# Altium footprint library CUSTOM PCB.PcbLib: 404 footprints (part 18 of 26)
Each footprint in its own frame and in the unit in brackets; x right, y up, seen from the top. Pads: shape width x height; smd on the part's side, far side on the other; paste and mask are expansions set on the pad; w line width, h text height; cw(c..) or ccw(c..) is an arc to the next point about the centre after c.
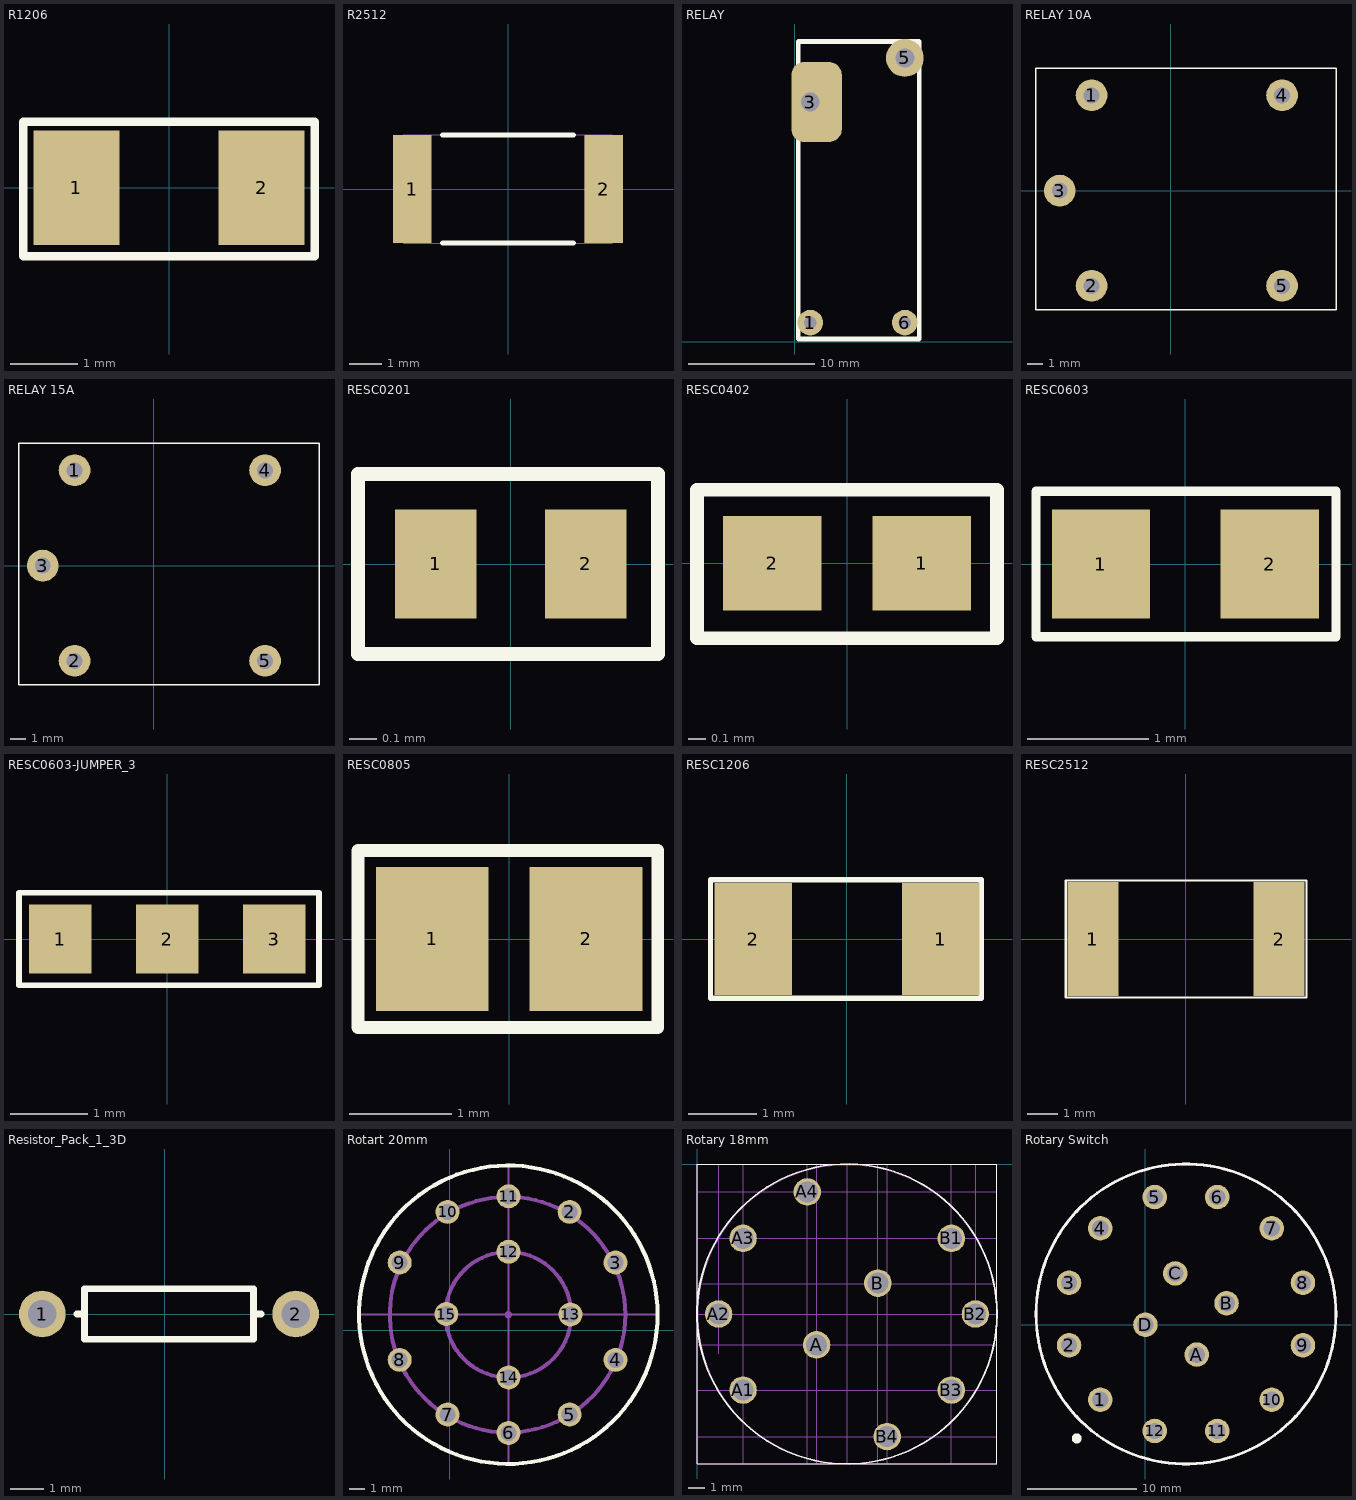
[diagram p17: the footprints below, top view; thin cyan lines are the x and y axes]

## R1206 [mil]
pads (2):
  rect 50x67 smd paste+0 mask+0: 1(-54,0) 2(54,0)
Top Overlay:
  lines w5: -85,-40 -85,38.5 16.89,38.5 85,38.5 85,-40 -85,-40
3D body "STA_RNCP1206.step": height 24.02, standoff 0, extent -65,-33.5 65,33.5

## R2512 [mil]
pads (2):
  rect 47x132 smd: 1(-117,0) 2(117,0)
Top Overlay:
  lines w6: -80,-66 80,-66 ; -80,66 80,66
Mechanical 4:
  lines w0: -127,-66 -94,-66 ; -127,-66 -127,66 ; -127,-66 -94,-66 ; -127,-66 -127,66 ; -127,66 -94,66 ; -127,66 -94,66 ; -94,-66 -94,66 ; -94,-66 94,-66 ; -94,-66 -94,66 ; -94,-66 94,-66 ; -94,66 94,66 ; -94,66 94,66 ; 94,-66 94,66 ; 94,-66 127,-66 ; 94,-66 94,66 ; 94,-66 127,-66 ; 94,66 127,66 ; 94,66 127,66 ; 127,-66 127,66 ; 127,-66 127,66
3D body "RESISTOR 2512.step": height 22.83, standoff -1.18, extent -124.99,-64.16 125.01,64.18

## RELAY [mm] "Relay Philips"
pads (4):
  round 2.032 hole 1: 1(1.25,1.5) 6(8.75,1.5)
  rrect50% 4x6.35 hole 1.5 copper offset 0.5,0: 3(1.25,19)
  round 3 hole 1.5: 5(8.75,22.505)
Top Overlay:
  lines w0.381: 0.3,0.2 0.3,23.8 9.9,23.8 9.9,0.2 1.2,0.2 0.3,0.2
3D body "adw1112hlw.step": height 15.59, standoff -3.41, extent 0.08,0.04 10.08,24.04

## RELAY 10A [mm]
pads (5):
  round 2 hole 1: 1(-5,6) 2(-5,-6) 3(-7,0) 4(7,6) 5(7,-6)
Top Overlay:
  lines w0.09: -8.5,-7.5 -8.5,7.7 10.4,7.7 10.4,-7.5 -8.5,-7.5
3D body "relevador.SLDPRT": height 15.4, standoff -2.4, extent -8.533,-7.7 10.667,7.7

## RELAY 15A [mm]
pads (5):
  round 2 hole 1: 1(-5,6) 2(-5,-6) 3(-7,0) 4(7,6) 5(7,-6)
Top Overlay:
  lines w0.09: -8.5,-7.5 10.4,-7.5 10.4,7.7 -8.5,7.7 -8.5,-7.5
3D body "relevador.SLDPRT": height 15.4, standoff -2.4, extent -8.533,-7.7 10.667,7.7

## RESC0201 [mm]
pads (2):
  rect 0.3x0.4 smd: 1(-0.275,0) 2(0.275,0)
Top Overlay:
  lines w0.051: -0.56,-0.33 -0.56,0.33 0.54,0.33 0.54,-0.33 -0.56,-0.33
3D body "44025.stp": height 0.15, standoff -0.15, extent -0.3,-0.15 0.3,0.15

## RESC0402 [mm]
pads (2):
  rect 0.55x0.53 smd: 1(0.419,0) 2(-0.419,0)
Top Overlay:
  lines w0.076: -0.84,-0.42 -0.84,0.41 0.84,0.41 0.84,-0.42 -0.84,-0.42
3D body "0402_RES.stp": height 0.31, standoff -0.05, extent -0.5,-0.251 0.5,0.251

## RESC0603 [mm]
pads (2):
  rect 0.81x0.9 smd: 1(-0.695,0) 2(0.695,0)
Top Overlay:
  lines w0.076: -1.23,-0.6 -1.23,0.6 1.24,0.6 1.24,-0.6 -1.23,-0.6
3D body "SMD R-0603.STEP": height 0.45, standoff -0.01, extent -0.8,-0.4 0.8,0.4

## RESC0603-JUMPER_3 [mm]
pads (3):
  rect 0.81x0.9 smd: 1(-1.39,0) 2(0,0) 3(1.39,0)
Top Layer:
  pour cut-out: 0,0
Top Overlay:
  lines w0.076: -1.925,-0.6 -1.925,0.6 1.972,0.6 1.972,-0.6 -1.925,-0.6
3D body "SMD R-0603.STEP": height 0.45, standoff -0.01, extent -1.495,-0.4 0.105,0.4

## RESC0805 [mm]
pads (2):
  rect 1.1x1.4 smd: 1(-0.75,0) 2(0.75,0)
Top Overlay:
  lines w0.125: -1.473,-0.864 -1.473,0.864 1.448,0.864 1.448,-0.864 -1.473,-0.864
3D body: height 0.25, standoff 0, extent -0.432,1.6 -0.432,1.6
3D body "0805_RES.stp": height 0.53, standoff -0.08, extent -1.025,-0.615 0.975,0.635

## RESC1206 [mm]
pads (2):
  rect 1.14x1.65 smd: 1(1.375,0) 2(-1.375,0)
Top Overlay:
  lines w0.076: -2,-0.87 1.97,-0.87 1.97,0.87 -2,0.87 -2,-0.87
3D body "1206_RES.stp": height 0.75, standoff -0.1, extent -1.6,-0.8 1.6,0.8

## RESC2512 [mil]
pads (2):
  rect 65x145 smd: 1(-118.58,0) 2(118.58,0)
Top Overlay:
  lines w3: -153.15,-74.41 -153.15,74.8 153.54,74.8 153.54,-74.41 -153.15,-74.41
3D body "SMD 2512.stp": height 24.31, standoff -0.69, extent -125,-62.51 124.99,62.49

## Resistor_Pack_1_3D [mm] "Axial 0.3"
pads (2):
  round 1.4 hole 0.85: 1(-3.683,0) 2(3.937,0)
Top Overlay:
  lines w0.2: -2.642,0 -2.413,0 ; 2.896,0 2.667,0 ; 2.667,0 2.667,-0.762 -2.413,-0.762 -2.413,0.762 2.667,0.762 2.667,0
3D body "User Library-Resistencia-1.STEP": height 3.51, standoff 0, extent -3.937,-0.971 4.191,0.971

## Rotart 20mm [mil]
pads (14):
  round 60 hole 40: 2(300,297) 3(415,170) 4(415,-74) 5(300,-211) 6(147,-257) 7(-6,-211) 8(-126,-74) 9(-126,170) 10(-6,297) 11(147,336) 12(147,197) 13(302,40) 14(147,-118) 15(-9,41)
Top Overlay:
  circle w10: c146.41,39.23 r374.02
Mechanical 1:
  lines w5: -230,40 521,40 147,40 ; -116,-222 -115,-222 ; 146,40 147,40 ; 147,-335 147,417 147,40 ; 149,40 147,40 ; 412,-223 412,-221
Mechanical 15:
  circle w10: c144.41,39.23 r295.28
  circle w10: c146.41,39.23 r157.48
  circle w10: c146.41,39.23 r3.94
3D body: height 539.37, standoff 440.94, extent -112.9,-217.9 398.91,293.91
3D body: height 94.49, standoff 0, extent -249,388 -249,388
3D body: height 94.49, standoff 0, extent -297,345 -297,345
3D body: height 437.01, standoff 3.94, extent -229.03,-336.89 519,410.89
3D body: height 984.25, standoff 511.81, extent 46.56,-61.3 243.41,135.3

## Rotary 18mm [mil] "2 Pole 5 Position"
pads (10):
  round 65 hole 50: A(282,-427) A1(108,-534) A2(50,-354) A3(108,-175) A4(260,-65) B(427,-281) B1(601,-175) B2(658,-354) B3(601,-534) B4(449,-644)
Top Overlay:
  circle w3.94: c354,-354 r355
  lines w1: 0,-709 0,0 709,0 709,-709 0,-709
Mechanical 4:
  circle w3.94: c354.5,-354.5 r354.33
  lines w1: 0,-644 709,-644 ; 0,-534 709,-534 ; 0,-427 709,-427 ; 0,-354.5 709,-354.5 ; 0,-282 709,-282 ; 0,-175 709,-175 ; 0,-65 709,-65 ; 50,-448 50,0 ; 108,-709 108,0 ; 260,-709 260,0 ; 282,-709 282,0 ; 354.5,-709 354.5,0 ; 427,-709 427,0 ; 449,-709 449,0 ; 601,-709 601,0 ; 659,-367 659,0 ; 0,-709 709,-709 709,0 0,0 0,-709
3D body: height 379, standoff 5, extent -0.99,-707.87 707.01,-0.12

## Rotary Switch [mm] "2x6 position"
pads (16):
  round 2.25 hole 1.5: 1(-4.13,-6.852) 2(-7.003,-1.876) 3(-7.003,3.869) 4(-4.13,8.845) 5(0.846,11.718) 6(6.592,11.718) 7(11.568,8.845) 8(14.441,3.869) 9(14.441,-1.876) 10(11.568,-6.852) 11(6.592,-9.725) 12(0.846,-9.725) A(4.715,-2.722) B(7.438,1.993) C(2.722,4.715) D(0,0)
Top Overlay:
  circle w0.254: c3.719,0.996 r13.75
  circle w0.5: c-6.3,-10.407 r0.204
Mechanical 15:
  circle w0.254: c3.719,0.996 r13.75
3D body "Stufenschalter 2x6.step": height 62.8, standoff -4, extent -14.1,-16.975 21.684,18.811